# Altium schematic symbol library jlcpcb_2025_04_inductors_extended_0603.schlib: 1269 symbols (part 5 of 7) (continued)
## MLI1608F-1R0KT
designator L?  Inductance: 1uH
Inductor, 1uH, ±10%, 0.6Ω, 25mA, SMD 0603; Manufacturer: Meled; Manufacturer Part Number: MLI1608F-1R0KT; Self-Resonant Frequency: 75MHz; Q Factor: 35@10MHz; Package Size: 0603; JLCPCB Basic Part: No; JLCPCB Part Number: C2885856; Supplier 1: LCSC; Category: Inductors; Supplier Part Number 1: C2885856; Tolerance: ±10%; Rated Current: 25mA; DC Resistance: 0.6Ω; RoHS: Yes; ComponentLink1Description: Datasheet; ComponentLink1URL: https://wmsc.lcsc.com/wmsc/upload/file/pdf/v2/lcsc/2306021138_MetalLions-MLI1608F-1R0KT_C2885856.pdf; ComponentLink2Description: JLCPCB Part URL; ComponentLink2URL: https://jlcpcb.com/partdetail/C2885856; ComponentLink3Description: LCSC Part URL; ComponentLink3URL: https://lcsc.com/product-detail/Inductors-SMD_MetalLions-MetalLions-MLI1608F-1R0KT_C2885856.html
footprint IND-0603 (0603 (1608M) Inductor)
pins: 1, 2

## MLI1608F-1R2KT
designator L?  Inductance: 1.2uH
Inductor, 1.2uH, ±10%, 0.8Ω, 25mA, SMD 0603; Manufacturer: Meled; Manufacturer Part Number: MLI1608F-1R2KT; Self-Resonant Frequency: 65MHz; Q Factor: 35@10MHz; Package Size: 0603; JLCPCB Basic Part: No; JLCPCB Part Number: C2885857; Supplier 1: LCSC; Category: Inductors; Supplier Part Number 1: C2885857; Tolerance: ±10%; Rated Current: 25mA; DC Resistance: 0.8Ω; RoHS: Yes; ComponentLink1Description: Datasheet; ComponentLink1URL: https://wmsc.lcsc.com/wmsc/upload/file/pdf/v2/lcsc/2306021138_MetalLions-MLI1608F-1R2KT_C2885857.pdf; ComponentLink2Description: JLCPCB Part URL; ComponentLink2URL: https://jlcpcb.com/partdetail/C2885857; ComponentLink3Description: LCSC Part URL; ComponentLink3URL: https://lcsc.com/product-detail/Inductors-SMD_MetalLions-MetalLions-MLI1608F-1R2KT_C2885857.html
footprint IND-0603 (0603 (1608M) Inductor)
pins: 1, 2

## MLI1608F-1R8KT
designator L?  Inductance: 1.8uH
Inductor, 1.8uH, ±10%, 0.95Ω, 25mA, SMD 0603; Manufacturer: Meled; Manufacturer Part Number: MLI1608F-1R8KT; Self-Resonant Frequency: 55MHz; Q Factor: 35@10MHz; Package Size: 0603; JLCPCB Basic Part: No; JLCPCB Part Number: C2885859; Supplier 1: LCSC; Category: Inductors; Supplier Part Number 1: C2885859; Tolerance: ±10%; Rated Current: 25mA; DC Resistance: 0.95Ω; RoHS: Yes; ComponentLink1Description: Datasheet; ComponentLink1URL: https://wmsc.lcsc.com/wmsc/upload/file/pdf/v2/lcsc/2306021138_MetalLions-MLI1608F-1R8KT_C2885859.pdf; ComponentLink2Description: JLCPCB Part URL; ComponentLink2URL: https://jlcpcb.com/partdetail/C2885859; ComponentLink3Description: LCSC Part URL; ComponentLink3URL: https://lcsc.com/product-detail/Inductors-SMD_MetalLions-MetalLions-MLI1608F-1R8KT_C2885859.html
footprint IND-0603 (0603 (1608M) Inductor)
pins: 1, 2

## MLI1608F-6R8KT
designator L?  Inductance: 6.8uH
Inductor, 6.8uH, ±10%, 1.7Ω, 5mA, SMD 0603; Manufacturer: Meled; Manufacturer Part Number: MLI1608F-6R8KT; Self-Resonant Frequency: 20MHz; Q Factor: 35@4MHz; Package Size: 0603; JLCPCB Basic Part: No; JLCPCB Part Number: C2885866; Supplier 1: LCSC; Category: Inductors; Supplier Part Number 1: C2885866; Tolerance: ±10%; Rated Current: 5mA; DC Resistance: 1.7Ω; RoHS: Yes; ComponentLink1Description: Datasheet; ComponentLink1URL: https://wmsc.lcsc.com/wmsc/upload/file/pdf/v2/lcsc/2306021138_MetalLions-MLI1608F-6R8KT_C2885866.pdf; ComponentLink2Description: JLCPCB Part URL; ComponentLink2URL: https://jlcpcb.com/partdetail/C2885866; ComponentLink3Description: LCSC Part URL; ComponentLink3URL: https://lcsc.com/product-detail/Inductors-SMD_MetalLions-MetalLions-MLI1608F-6R8KT_C2885866.html
footprint IND-0603 (0603 (1608M) Inductor)
pins: 1, 2

## MLI1608F-100KT
designator L?  Inductance: 10uH
Inductor, 10uH, ±10%, 1.85Ω, 3mA, SMD 0603; Manufacturer: Meled; Manufacturer Part Number: MLI1608F-100KT; Self-Resonant Frequency: 17MHz; Q Factor: 30@2MHz; Package Size: 0603; JLCPCB Basic Part: No; JLCPCB Part Number: C2885868; Supplier 1: LCSC; Category: Inductors; Supplier Part Number 1: C2885868; Tolerance: ±10%; Rated Current: 3mA; DC Resistance: 1.85Ω; RoHS: Yes; ComponentLink1Description: Datasheet; ComponentLink1URL: https://wmsc.lcsc.com/wmsc/upload/file/pdf/v2/lcsc/2306021138_MetalLions-MLI1608F-100KT_C2885868.pdf; ComponentLink2Description: JLCPCB Part URL; ComponentLink2URL: https://jlcpcb.com/partdetail/C2885868; ComponentLink3Description: LCSC Part URL; ComponentLink3URL: https://lcsc.com/product-detail/Inductors-SMD_MetalLions-MetalLions-MLI1608F-100KT_C2885868.html
footprint IND-0603 (0603 (1608M) Inductor)
pins: 1, 2

## MLI1608F-150KT
designator L?  Inductance: 15uH
Inductor, 15uH, ±10%, 1.7Ω, 1mA, SMD 0603; Manufacturer: Meled; Manufacturer Part Number: MLI1608F-150KT; Self-Resonant Frequency: 14MHz; Q Factor: 20@1MHz; Package Size: 0603; JLCPCB Basic Part: No; JLCPCB Part Number: C2885870; Supplier 1: LCSC; Category: Inductors; Supplier Part Number 1: C2885870; Tolerance: ±10%; Rated Current: 1mA; DC Resistance: 1.7Ω; RoHS: Yes; ComponentLink1Description: Datasheet; ComponentLink1URL: https://wmsc.lcsc.com/wmsc/upload/file/pdf/v2/lcsc/2306021138_MetalLions-MLI1608F-150KT_C2885870.pdf; ComponentLink2Description: JLCPCB Part URL; ComponentLink2URL: https://jlcpcb.com/partdetail/C2885870; ComponentLink3Description: LCSC Part URL; ComponentLink3URL: https://lcsc.com/product-detail/Inductors-SMD_MetalLions-MetalLions-MLI1608F-150KT_C2885870.html
footprint IND-0603 (0603 (1608M) Inductor)
pins: 1, 2

## MLI1608F-270KT
designator L?  Inductance: 27uH
Inductor, 27uH, ±10%, 2.75Ω, 1mA, SMD 0603; Manufacturer: Meled; Manufacturer Part Number: MLI1608F-270KT; Self-Resonant Frequency: 10MHz; Q Factor: 20@1MHz; Package Size: 0603; JLCPCB Basic Part: No; JLCPCB Part Number: C2885873; Supplier 1: LCSC; Category: Inductors; Supplier Part Number 1: C2885873; Tolerance: ±10%; Rated Current: 1mA; DC Resistance: 2.75Ω; RoHS: Yes; ComponentLink1Description: Datasheet; ComponentLink1URL: https://wmsc.lcsc.com/wmsc/upload/file/pdf/v2/lcsc/2306021138_MetalLions-MLI1608F-270KT_C2885873.pdf; ComponentLink2Description: JLCPCB Part URL; ComponentLink2URL: https://jlcpcb.com/partdetail/C2885873; ComponentLink3Description: LCSC Part URL; ComponentLink3URL: https://lcsc.com/product-detail/Inductors-SMD_MetalLions-MetalLions-MLI1608F-270KT_C2885873.html
footprint IND-0603 (0603 (1608M) Inductor)
pins: 1, 2

## MLI1608F-R15KT
designator L?  Inductance: 0.15uH
Inductor, 0.15uH, ±10%, 0.6Ω, 50mA, SMD 0603; Manufacturer: Meled; Manufacturer Part Number: MLI1608F-R15KT; Self-Resonant Frequency: 180MHz; Q Factor: 15@25MHz; Package Size: 0603; JLCPCB Basic Part: No; JLCPCB Part Number: C2885846; Supplier 1: LCSC; Category: Inductors; Supplier Part Number 1: C2885846; Tolerance: ±10%; Rated Current: 50mA; DC Resistance: 0.6Ω; RoHS: Yes; ComponentLink1Description: Datasheet; ComponentLink1URL: https://wmsc.lcsc.com/wmsc/upload/file/pdf/v2/lcsc/2306021138_MetalLions-MLI1608F-R15KT_C2885846.pdf; ComponentLink2Description: JLCPCB Part URL; ComponentLink2URL: https://jlcpcb.com/partdetail/C2885846; ComponentLink3Description: LCSC Part URL; ComponentLink3URL: https://lcsc.com/product-detail/Inductors-SMD_MetalLions-MetalLions-MLI1608F-R15KT_C2885846.html
footprint IND-0603 (0603 (1608M) Inductor)
pins: 1, 2

## MLI1608F-R47KT
designator L?  Inductance: 470nH
Inductor, 470nH, ±10%, 1.35Ω, 35mA, SMD 0603; Manufacturer: Meled; Manufacturer Part Number: MLI1608F-R47KT; Self-Resonant Frequency: 105MHz; Q Factor: 15@25MHz; Package Size: 0603; JLCPCB Basic Part: No; JLCPCB Part Number: C2885852; Supplier 1: LCSC; Category: Inductors; Supplier Part Number 1: C2885852; Tolerance: ±10%; Rated Current: 35mA; DC Resistance: 1.35Ω; RoHS: Yes; ComponentLink1Description: Datasheet; ComponentLink1URL: https://wmsc.lcsc.com/wmsc/upload/file/pdf/v2/lcsc/2306021138_MetalLions-MLI1608F-R47KT_C2885852.pdf; ComponentLink2Description: JLCPCB Part URL; ComponentLink2URL: https://jlcpcb.com/partdetail/C2885852; ComponentLink3Description: LCSC Part URL; ComponentLink3URL: https://lcsc.com/product-detail/Inductors-SMD_MetalLions-MetalLions-MLI1608F-R47KT_C2885852.html
footprint IND-0603 (0603 (1608M) Inductor)
pins: 1, 2

## MLI1608F-R68KT
designator L?  Inductance: 0.68uH
Inductor, 0.68uH, ±10%, 1.7Ω, 35mA, SMD 0603; Manufacturer: Meled; Manufacturer Part Number: MLI1608F-R68KT; Self-Resonant Frequency: 90MHz; Q Factor: 15@25MHz; Package Size: 0603; JLCPCB Basic Part: No; JLCPCB Part Number: C2885854; Supplier 1: LCSC; Category: Inductors; Supplier Part Number 1: C2885854; Tolerance: ±10%; Rated Current: 35mA; DC Resistance: 1.7Ω; RoHS: Yes; ComponentLink1Description: Datasheet; ComponentLink1URL: https://wmsc.lcsc.com/wmsc/upload/file/pdf/v2/lcsc/2306021138_MetalLions-MLI1608F-R68KT_C2885854.pdf; ComponentLink2Description: JLCPCB Part URL; ComponentLink2URL: https://jlcpcb.com/partdetail/C2885854; ComponentLink3Description: LCSC Part URL; ComponentLink3URL: https://lcsc.com/product-detail/Inductors-SMD_MetalLions-MetalLions-MLI1608F-R68KT_C2885854.html
footprint IND-0603 (0603 (1608M) Inductor)
pins: 1, 2

## MLJ1608WR15JT000
designator L?  Inductance: 150nH
Inductor, 150nH, ±5%, 160mΩ, SMD 0603; Manufacturer: TDK; Manufacturer Part Number: MLJ1608WR15JT000; Saturation Current: 600mA; Self-Resonant Frequency: 350MHz; Q Factor: 15@25MHz; Package Size: 0603; JLCPCB Basic Part: No; JLCPCB Part Number: C3910555; Supplier 1: LCSC; Category: Inductors; Supplier Part Number 1: C3910555; Tolerance: ±5%; DC Resistance: 160mΩ; RoHS: Yes; ComponentLink1Description: Datasheet; ComponentLink1URL: https://wmsc.lcsc.com/wmsc/upload/file/pdf/v2/lcsc/2401221719_TDK-MLJ1608WR15JT000_C3910555.pdf; ComponentLink2Description: JLCPCB Part URL; ComponentLink2URL: https://jlcpcb.com/partdetail/C3910555; ComponentLink3Description: LCSC Part URL; ComponentLink3URL: https://lcsc.com/product-detail/Inductors-SMD_TDK-TDK-MLJ1608WR15JT000_C3910555.html
footprint IND-0603 (0603 (1608M) Inductor)
pins: 1, 2

## MLJ1608WR16JT000
designator L?  Inductance: 160nH
Inductor, 160nH, ±5%, 160mΩ, 700mA, SMD 0603; Manufacturer: TDK; Manufacturer Part Number: MLJ1608WR16JT000; Saturation Current: 750mA; Self-Resonant Frequency: 450MHz; Q Factor: 15@25MHz; Package Size: 0603; JLCPCB Basic Part: No; JLCPCB Part Number: C434822; Supplier 1: LCSC; Category: Inductors; Supplier Part Number 1: C434822; Tolerance: ±5%; Rated Current: 700mA; DC Resistance: 160mΩ; RoHS: Yes; ComponentLink1Description: Datasheet; ComponentLink1URL: https://wmsc.lcsc.com/wmsc/upload/file/pdf/v2/lcsc/2304140030_TDK-MLJ1608WR16JT000_C434822.pdf; ComponentLink2Description: JLCPCB Part URL; ComponentLink2URL: https://jlcpcb.com/partdetail/C434822; ComponentLink3Description: LCSC Part URL; ComponentLink3URL: https://lcsc.com/product-detail/Inductors-SMD_TDK-TDK-MLJ1608WR16JT000_C434822.html
footprint IND-0603 (0603 (1608M) Inductor)
pins: 1, 2

## MLJ1608WR18JT000
designator L?  Inductance: 180nH
Inductor, 180nH, ±5%, 200mΩ, 650mA, SMD 0603; Manufacturer: TDK; Manufacturer Part Number: MLJ1608WR18JT000; Saturation Current: 700mA; Self-Resonant Frequency: 440MHz; Q Factor: 15@25MHz; Package Size: 0603; JLCPCB Basic Part: No; JLCPCB Part Number: C502011; Supplier 1: LCSC; Category: Inductors; Supplier Part Number 1: C502011; Tolerance: ±5%; Rated Current: 650mA; DC Resistance: 200mΩ; RoHS: Yes; ComponentLink1Description: Datasheet; ComponentLink1URL: https://wmsc.lcsc.com/wmsc/upload/file/pdf/v2/lcsc/2003301511_TDK-MLJ1608WR18JT000_C502011.pdf; ComponentLink2Description: JLCPCB Part URL; ComponentLink2URL: https://jlcpcb.com/partdetail/C502011; ComponentLink3Description: LCSC Part URL; ComponentLink3URL: https://lcsc.com/product-detail/Inductors-SMD_TDK-TDK-MLJ1608WR18JT000_C502011.html
footprint IND-0603 (0603 (1608M) Inductor)
pins: 1, 2

## MLJ1608WR27JT000
designator L?  Inductance: 270nH
Inductor, 270nH, ±5%, 290mΩ, 550mA, SMD 0603; Manufacturer: TDK; Manufacturer Part Number: MLJ1608WR27JT000; Saturation Current: 650mA; Self-Resonant Frequency: 350MHz; Q Factor: 15@25MHz; Package Size: 0603; JLCPCB Basic Part: No; JLCPCB Part Number: C2041707; Supplier 1: LCSC; Category: Inductors; Supplier Part Number 1: C2041707; Tolerance: ±5%; Rated Current: 550mA; DC Resistance: 290mΩ; RoHS: Yes; ComponentLink1Description: Datasheet; ComponentLink1URL: https://wmsc.lcsc.com/wmsc/upload/file/pdf/v2/lcsc/2304140030_TDK-MLJ1608WR27JT000_C2041707.pdf; ComponentLink2Description: JLCPCB Part URL; ComponentLink2URL: https://jlcpcb.com/partdetail/C2041707; ComponentLink3Description: LCSC Part URL; ComponentLink3URL: https://lcsc.com/product-detail/Inductors-SMD_TDK-TDK-MLJ1608WR27JT000_C2041707.html
footprint IND-0603 (0603 (1608M) Inductor)
pins: 1, 2

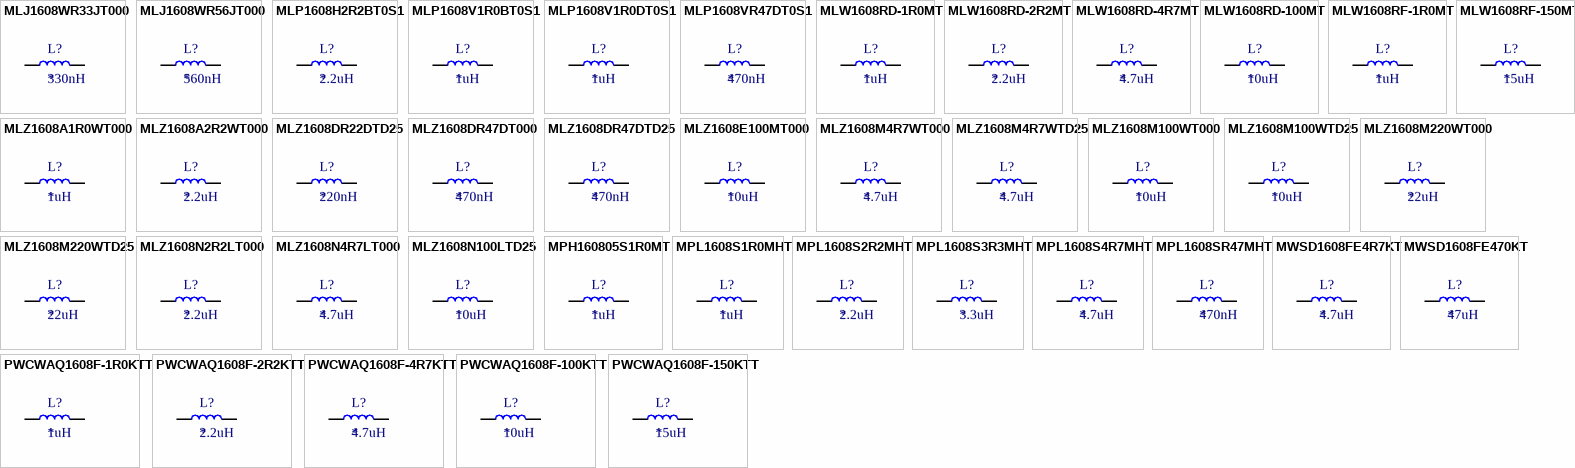
[diagram p22: symbols MLJ1608WR33JT000 to PWCWAQ1608F-150KTT]

## MLJ1608WR33JT000
designator L?  Inductance: 330nH
Inductor, 330nH, ±5%, 320mΩ, 500mA, SMD 0603; Manufacturer: TDK; Manufacturer Part Number: MLJ1608WR33JT000; Saturation Current: 650mA; Self-Resonant Frequency: 320MHz; Q Factor: 15@25MHz; Package Size: 0603; JLCPCB Basic Part: No; JLCPCB Part Number: C502010; Supplier 1: LCSC; Category: Inductors; Supplier Part Number 1: C502010; Tolerance: ±5%; Rated Current: 500mA; DC Resistance: 320mΩ; RoHS: Yes; ComponentLink1Description: Datasheet; ComponentLink1URL: https://wmsc.lcsc.com/wmsc/upload/file/pdf/v2/lcsc/2304140030_TDK-MLJ1608WR33JT000_C502010.pdf; ComponentLink2Description: JLCPCB Part URL; ComponentLink2URL: https://jlcpcb.com/partdetail/C502010; ComponentLink3Description: LCSC Part URL; ComponentLink3URL: https://lcsc.com/product-detail/Inductors-SMD_TDK-TDK-MLJ1608WR33JT000_C502010.html
footprint IND-0603 (0603 (1608M) Inductor)
pins: 1, 2

## MLJ1608WR56JT000
designator L?  Inductance: 560nH
Inductor, 560nH, ±5%, 520mΩ, 400mA, SMD 0603; Manufacturer: TDK; Manufacturer Part Number: MLJ1608WR56JT000; Saturation Current: 600mA; Self-Resonant Frequency: 230MHz; Q Factor: 15@25MHz; Package Size: 0603; JLCPCB Basic Part: No; JLCPCB Part Number: C502009; Supplier 1: LCSC; Category: Inductors; Supplier Part Number 1: C502009; Tolerance: ±5%; Rated Current: 400mA; DC Resistance: 520mΩ; RoHS: Yes; ComponentLink1Description: Datasheet; ComponentLink1URL: https://wmsc.lcsc.com/wmsc/upload/file/pdf/v2/lcsc/2304140030_TDK-MLJ1608WR56JT000_C502009.pdf; ComponentLink2Description: JLCPCB Part URL; ComponentLink2URL: https://jlcpcb.com/partdetail/C502009; ComponentLink3Description: LCSC Part URL; ComponentLink3URL: https://lcsc.com/product-detail/Inductors-SMD_TDK-TDK-MLJ1608WR56JT000_C502009.html
footprint IND-0603 (0603 (1608M) Inductor)
pins: 1, 2

## MLP1608H2R2BT0S1
designator L?  Inductance: 2.2uH
Inductor, 2.2uH, ±20%, 390mΩ, 750mA, SMD 0603; Manufacturer: TDK; Manufacturer Part Number: MLP1608H2R2BT0S1; Package Size: 0603; JLCPCB Basic Part: No; JLCPCB Part Number: C129931; Supplier 1: LCSC; Category: Inductors; Supplier Part Number 1: C129931; Tolerance: ±20%; Rated Current: 750mA; DC Resistance: 390mΩ; RoHS: Yes; ComponentLink1Description: Datasheet; ComponentLink1URL: https://wmsc.lcsc.com/wmsc/upload/file/pdf/v2/lcsc/1811131642_TDK-MLP1608H2R2BT0S1_C129931.pdf; ComponentLink2Description: JLCPCB Part URL; ComponentLink2URL: https://jlcpcb.com/partdetail/C129931; ComponentLink3Description: LCSC Part URL; ComponentLink3URL: https://lcsc.com/product-detail/Inductors-SMD_TDK-TDK-MLP1608H2R2BT0S1_C129931.html
footprint IND-0603 (0603 (1608M) Inductor)
pins: 1, 2

## MLP1608V1R0BT0S1
designator L?  Inductance: 1uH
Inductor, 1uH, ±20%, 300mΩ, 700mA, SMD 0603; Manufacturer: TDK; Manufacturer Part Number: MLP1608V1R0BT0S1; Package Size: 0603; JLCPCB Basic Part: No; JLCPCB Part Number: C383366; Supplier 1: LCSC; Category: Inductors; Supplier Part Number 1: C383366; Tolerance: ±20%; Rated Current: 700mA; DC Resistance: 300mΩ; RoHS: Yes; ComponentLink1Description: Datasheet; ComponentLink1URL: https://wmsc.lcsc.com/wmsc/upload/file/pdf/v2/lcsc/1912111437_TDK-MLP1608V1R0BT0S1_C383366.pdf; ComponentLink2Description: JLCPCB Part URL; ComponentLink2URL: https://jlcpcb.com/partdetail/C383366; ComponentLink3Description: LCSC Part URL; ComponentLink3URL: https://lcsc.com/product-detail/Inductors-SMD_TDK-TDK-MLP1608V1R0BT0S1_C383366.html
footprint IND-0603 (0603 (1608M) Inductor)
pins: 1, 2

## MLP1608V1R0DT0S1
designator L?  Inductance: 1uH
Inductor, 1uH, ±20%, 300mΩ, 700mA, SMD 0603; Manufacturer: TDK; Manufacturer Part Number: MLP1608V1R0DT0S1; Package Size: 0603; JLCPCB Basic Part: No; JLCPCB Part Number: C307741; Supplier 1: LCSC; Category: Inductors; Supplier Part Number 1: C307741; Tolerance: ±20%; Rated Current: 700mA; DC Resistance: 300mΩ; RoHS: Yes; ComponentLink1Description: Datasheet; ComponentLink1URL: https://wmsc.lcsc.com/wmsc/upload/file/pdf/v2/lcsc/2304140030_TDK-MLP1608V1R0DT0S1_C307741.pdf; ComponentLink2Description: JLCPCB Part URL; ComponentLink2URL: https://jlcpcb.com/partdetail/C307741; ComponentLink3Description: LCSC Part URL; ComponentLink3URL: https://lcsc.com/product-detail/Inductors-SMD_TDK-TDK-MLP1608V1R0DT0S1_C307741.html
footprint IND-0603 (0603 (1608M) Inductor)
pins: 1, 2

## MLP1608VR47DT0S1
designator L?  Inductance: 470nH
Inductor, 470nH, ±20%, 260mΩ, 800mA, SMD 0603; Manufacturer: TDK; Manufacturer Part Number: MLP1608VR47DT0S1; Package Size: 0603; JLCPCB Basic Part: No; JLCPCB Part Number: C105533; Supplier 1: LCSC; Category: Inductors; Supplier Part Number 1: C105533; Tolerance: ±20%; Rated Current: 800mA; DC Resistance: 260mΩ; RoHS: Yes; ComponentLink1Description: Datasheet; ComponentLink1URL: https://wmsc.lcsc.com/wmsc/upload/file/pdf/v2/lcsc/1811131643_TDK-MLP1608VR47DT0S1_C105533.pdf; ComponentLink2Description: JLCPCB Part URL; ComponentLink2URL: https://jlcpcb.com/partdetail/C105533; ComponentLink3Description: LCSC Part URL; ComponentLink3URL: https://lcsc.com/product-detail/Inductors-SMD_TDK-TDK-MLP1608VR47DT0S1_C105533.html
footprint IND-0603 (0603 (1608M) Inductor)
pins: 1, 2

## MLW1608RD-1R0MT
designator L?  Inductance: 1uH
Inductor, 1uH, ±20%, SMD 0603; Manufacturer: Meled; Manufacturer Part Number: MLW1608RD-1R0MT; Package Size: 0603; JLCPCB Basic Part: No; JLCPCB Part Number: C2885957; Supplier 1: LCSC; Category: Inductors; Supplier Part Number 1: C2885957; Tolerance: ±20%; RoHS: Yes; ComponentLink1Description: Datasheet; ComponentLink1URL: https://wmsc.lcsc.com/wmsc/upload/file/pdf/v2/lcsc/2306021139_MetalLions-MLW1608RD-1R0MT_C2885957.pdf; ComponentLink2Description: JLCPCB Part URL; ComponentLink2URL: https://jlcpcb.com/partdetail/C2885957; ComponentLink3Description: LCSC Part URL; ComponentLink3URL: https://lcsc.com/product-detail/Inductors-SMD_MetalLions-MetalLions-MLW1608RD-1R0MT_C2885957.html
footprint IND-0603 (0603 (1608M) Inductor)
pins: 1, 2

## MLW1608RD-2R2MT
designator L?  Inductance: 2.2uH
Inductor, 2.2uH, ±20%, SMD 0603; Manufacturer: Meled; Manufacturer Part Number: MLW1608RD-2R2MT; Package Size: 0603; JLCPCB Basic Part: No; JLCPCB Part Number: C2885958; Supplier 1: LCSC; Category: Inductors; Supplier Part Number 1: C2885958; Tolerance: ±20%; RoHS: Yes; ComponentLink1Description: Datasheet; ComponentLink1URL: https://wmsc.lcsc.com/wmsc/upload/file/pdf/v2/lcsc/2306021139_MetalLions-MLW1608RD-2R2MT_C2885958.pdf; ComponentLink2Description: JLCPCB Part URL; ComponentLink2URL: https://jlcpcb.com/partdetail/C2885958; ComponentLink3Description: LCSC Part URL; ComponentLink3URL: https://lcsc.com/product-detail/Inductors-SMD_Meled-Meled-MLW1608RD-2R2MT_C2885958.html
footprint IND-0603 (0603 (1608M) Inductor)
pins: 1, 2

## MLW1608RD-4R7MT
designator L?  Inductance: 4.7uH
Inductor, 4.7uH, ±20%, SMD 0603; Manufacturer: Meled; Manufacturer Part Number: MLW1608RD-4R7MT; Package Size: 0603; JLCPCB Basic Part: No; JLCPCB Part Number: C2885959; Supplier 1: LCSC; Category: Inductors; Supplier Part Number 1: C2885959; Tolerance: ±20%; RoHS: Yes; ComponentLink1Description: Datasheet; ComponentLink1URL: https://wmsc.lcsc.com/wmsc/upload/file/pdf/v2/lcsc/2306021139_MetalLions-MLW1608RD-4R7MT_C2885959.pdf; ComponentLink2Description: JLCPCB Part URL; ComponentLink2URL: https://jlcpcb.com/partdetail/C2885959; ComponentLink3Description: LCSC Part URL; ComponentLink3URL: https://lcsc.com/product-detail/Inductors-SMD_MetalLions-MetalLions-MLW1608RD-4R7MT_C2885959.html
footprint IND-0603 (0603 (1608M) Inductor)
pins: 1, 2

## MLW1608RD-100MT
designator L?  Inductance: 10uH
Inductor, 10uH, ±20%, SMD 0603; Manufacturer: Meled; Manufacturer Part Number: MLW1608RD-100MT; Package Size: 0603; JLCPCB Basic Part: No; JLCPCB Part Number: C2885960; Supplier 1: LCSC; Category: Inductors; Supplier Part Number 1: C2885960; Tolerance: ±20%; RoHS: Yes; ComponentLink1Description: Datasheet; ComponentLink1URL: https://wmsc.lcsc.com/wmsc/upload/file/pdf/v2/lcsc/2306021139_MetalLions-MLW1608RD-100MT_C2885960.pdf; ComponentLink2Description: JLCPCB Part URL; ComponentLink2URL: https://jlcpcb.com/partdetail/C2885960; ComponentLink3Description: LCSC Part URL; ComponentLink3URL: https://lcsc.com/product-detail/Inductors-SMD_MetalLions-MetalLions-MLW1608RD-100MT_C2885960.html
footprint IND-0603 (0603 (1608M) Inductor)
pins: 1, 2

## MLW1608RF-1R0MT
designator L?  Inductance: 1uH
Inductor, 1uH, ±20%, 320mΩ, 860mA, SMD 0603; Manufacturer: Meled; Manufacturer Part Number: MLW1608RF-1R0MT; Self-Resonant Frequency: 390MHz; Package Size: 0603; JLCPCB Basic Part: No; JLCPCB Part Number: C2844624; Supplier 1: LCSC; Category: Inductors; Supplier Part Number 1: C2844624; Tolerance: ±20%; Rated Current: 860mA; DC Resistance: 320mΩ; RoHS: Yes; ComponentLink1Description: Datasheet; ComponentLink1URL: https://wmsc.lcsc.com/wmsc/upload/file/pdf/v2/lcsc/2306021145_MetalLions-MLW1608RF-1R0MT_C2844624.pdf; ComponentLink2Description: JLCPCB Part URL; ComponentLink2URL: https://jlcpcb.com/partdetail/C2844624; ComponentLink3Description: LCSC Part URL; ComponentLink3URL: https://lcsc.com/product-detail/Inductors-SMD_MetalLions-MetalLions-MLW1608RF-1R0MT_C2844624.html
footprint IND-0603 (0603 (1608M) Inductor)
pins: 1, 2

## MLW1608RF-150MT
designator L?  Inductance: 15uH
Inductor, 15uH, ±20%, 2.6Ω, 240mA, SMD 0603; Manufacturer: Meled; Manufacturer Part Number: MLW1608RF-150MT; Self-Resonant Frequency: 29MHz; Package Size: 0603; JLCPCB Basic Part: No; JLCPCB Part Number: C2844628; Supplier 1: LCSC; Category: Inductors; Supplier Part Number 1: C2844628; Tolerance: ±20%; Rated Current: 240mA; DC Resistance: 2.6Ω; RoHS: Yes; ComponentLink1Description: Datasheet; ComponentLink1URL: https://wmsc.lcsc.com/wmsc/upload/file/pdf/v2/lcsc/2306021145_MetalLions-MLW1608RF-150MT_C2844628.pdf; ComponentLink2Description: JLCPCB Part URL; ComponentLink2URL: https://jlcpcb.com/partdetail/C2844628; ComponentLink3Description: LCSC Part URL; ComponentLink3URL: https://lcsc.com/product-detail/Inductors-SMD_MetalLions-MetalLions-MLW1608RF-150MT_C2844628.html
footprint IND-0603 (0603 (1608M) Inductor)
pins: 1, 2

## MLZ1608A1R0WT000
designator L?  Inductance: 1uH
Inductor, 1uH, ±20%, 150mΩ, 600mA, SMD 0603; Manufacturer: TDK; Manufacturer Part Number: MLZ1608A1R0WT000; Saturation Current: 190mA; Package Size: 0603; JLCPCB Basic Part: No; JLCPCB Part Number: C307748; Supplier 1: LCSC; Category: Inductors; Supplier Part Number 1: C307748; Tolerance: ±20%; Rated Current: 600mA; DC Resistance: 150mΩ; RoHS: Yes; ComponentLink1Description: Datasheet; ComponentLink1URL: https://wmsc.lcsc.com/wmsc/upload/file/pdf/v2/lcsc/1811131655_TDK-MLZ1608A1R0WT000_C307748.pdf; ComponentLink2Description: JLCPCB Part URL; ComponentLink2URL: https://jlcpcb.com/partdetail/C307748; ComponentLink3Description: LCSC Part URL; ComponentLink3URL: https://lcsc.com/product-detail/Inductors-SMD_TDK-TDK-MLZ1608A1R0WT000_C307748.html
footprint IND-0603 (0603 (1608M) Inductor)
pins: 1, 2

## MLZ1608A2R2WT000
designator L?  Inductance: 2.2uH
Inductor, 2.2uH, ±20%, 250mΩ, 500mA, SMD 0603; Manufacturer: TDK; Manufacturer Part Number: MLZ1608A2R2WT000; Saturation Current: 130mA; Package Size: 0603; JLCPCB Basic Part: No; JLCPCB Part Number: C76797; Supplier 1: LCSC; Category: Inductors; Supplier Part Number 1: C76797; Tolerance: ±20%; Rated Current: 500mA; DC Resistance: 250mΩ; RoHS: Yes; ComponentLink1Description: Datasheet; ComponentLink1URL: https://wmsc.lcsc.com/wmsc/upload/file/pdf/v2/lcsc/1811131630_TDK-MLZ1608A2R2WT000_C76797.pdf; ComponentLink2Description: JLCPCB Part URL; ComponentLink2URL: https://jlcpcb.com/partdetail/C76797; ComponentLink3Description: LCSC Part URL; ComponentLink3URL: https://lcsc.com/product-detail/Inductors-SMD_TDK-TDK-MLZ1608A2R2WT000_C76797.html
footprint IND-0603 (0603 (1608M) Inductor)
pins: 1, 2

## MLZ1608DR22DTD25
designator L?  Inductance: 220nH
Inductor, 220nH, ±20%, 270mΩ, 600mA, SMD 0603; Manufacturer: TDK; Manufacturer Part Number: MLZ1608DR22DTD25; Saturation Current: 550mA; Package Size: 0603; JLCPCB Basic Part: No; JLCPCB Part Number: C404773; Supplier 1: LCSC; Category: Inductors; Supplier Part Number 1: C404773; Tolerance: ±20%; Rated Current: 600mA; DC Resistance: 270mΩ; RoHS: Yes; ComponentLink1Description: Datasheet; ComponentLink1URL: https://wmsc.lcsc.com/wmsc/upload/file/pdf/v2/lcsc/2304140030_TDK-MLZ1608DR22DTD25_C404773.pdf; ComponentLink2Description: JLCPCB Part URL; ComponentLink2URL: https://jlcpcb.com/partdetail/C404773; ComponentLink3Description: LCSC Part URL; ComponentLink3URL: https://lcsc.com/product-detail/Inductors-SMD_TDK-TDK-MLZ1608DR22DTD25_C404773.html
footprint IND-0603 (0603 (1608M) Inductor)
pins: 1, 2

## MLZ1608DR47DT000
designator L?  Inductance: 470nH
Inductor, 470nH, ±20%, 420mΩ, 500mA, SMD 0603; Manufacturer: TDK; Manufacturer Part Number: MLZ1608DR47DT000; Saturation Current: 400mA; Self-Resonant Frequency: 25MHz; Package Size: 0603; JLCPCB Basic Part: No; JLCPCB Part Number: C383392; Supplier 1: LCSC; Category: Inductors; Supplier Part Number 1: C383392; Tolerance: ±20%; Rated Current: 500mA; DC Resistance: 420mΩ; RoHS: Yes; ComponentLink1Description: Datasheet; ComponentLink1URL: https://wmsc.lcsc.com/wmsc/upload/file/pdf/v2/lcsc/2304140030_TDK-MLZ1608DR47DT000_C383392.pdf; ComponentLink2Description: JLCPCB Part URL; ComponentLink2URL: https://jlcpcb.com/partdetail/C383392; ComponentLink3Description: LCSC Part URL; ComponentLink3URL: https://lcsc.com/product-detail/Inductors-SMD_TDK-TDK-MLZ1608DR47DT000_C383392.html
footprint IND-0603 (0603 (1608M) Inductor)
pins: 1, 2

## MLZ1608DR47DTD25
designator L?  Inductance: 470nH
Inductor, 470nH, ±20%, 420mΩ, 500mA, SMD 0603; Manufacturer: TDK; Manufacturer Part Number: MLZ1608DR47DTD25; Saturation Current: 400mA; Package Size: 0603; JLCPCB Basic Part: No; JLCPCB Part Number: C404774; Supplier 1: LCSC; Category: Inductors; Supplier Part Number 1: C404774; Tolerance: ±20%; Rated Current: 500mA; DC Resistance: 420mΩ; RoHS: Yes; ComponentLink1Description: Datasheet; ComponentLink1URL: https://wmsc.lcsc.com/wmsc/upload/file/pdf/v2/lcsc/2304140030_TDK-MLZ1608DR47DTD25_C404774.pdf; ComponentLink2Description: JLCPCB Part URL; ComponentLink2URL: https://jlcpcb.com/partdetail/C404774; ComponentLink3Description: LCSC Part URL; ComponentLink3URL: https://lcsc.com/product-detail/Inductors-SMD_TDK-TDK-MLZ1608DR47DTD25_C404774.html
footprint IND-0603 (0603 (1608M) Inductor)
pins: 1, 2

## MLZ1608E100MT000
designator L?  Inductance: 10uH
Inductor, 10uH, ±20%, 900mΩ, 40mA, SMD 0603; Manufacturer: TDK; Manufacturer Part Number: MLZ1608E100MT000; Self-Resonant Frequency: 2MHz; Package Size: 0603; JLCPCB Basic Part: No; JLCPCB Part Number: C340673; Supplier 1: LCSC; Category: Inductors; Supplier Part Number 1: C340673; Tolerance: ±20%; Rated Current: 40mA; DC Resistance: 900mΩ; RoHS: Yes; ComponentLink1Description: Datasheet; ComponentLink2Description: JLCPCB Part URL; ComponentLink2URL: https://jlcpcb.com/partdetail/C340673; ComponentLink3Description: LCSC Part URL; ComponentLink3URL: https://lcsc.com/product-detail/Inductors-SMD_TDK-TDK-MLZ1608E100MT000_C340673.html
footprint IND-0603 (0603 (1608M) Inductor)
pins: 1, 2

## MLZ1608M4R7WT000
designator L?  Inductance: 4.7uH
Inductor, 4.7uH, ±20%, 500mΩ, 350mA, SMD 0603; Manufacturer: TDK; Manufacturer Part Number: MLZ1608M4R7WT000; Saturation Current: 120mA; Package Size: 0603; JLCPCB Basic Part: No; JLCPCB Part Number: C76799; Supplier 1: LCSC; Category: Inductors; Supplier Part Number 1: C76799; Tolerance: ±20%; Rated Current: 350mA; DC Resistance: 500mΩ; RoHS: Yes; ComponentLink1Description: Datasheet; ComponentLink1URL: https://wmsc.lcsc.com/wmsc/upload/file/pdf/v2/lcsc/2304140030_TDK-MLZ1608M4R7WT000_C76799.pdf; ComponentLink2Description: JLCPCB Part URL; ComponentLink2URL: https://jlcpcb.com/partdetail/C76799; ComponentLink3Description: LCSC Part URL; ComponentLink3URL: https://lcsc.com/product-detail/Inductors-SMD_TDK-TDK-MLZ1608M4R7WT000_C76799.html
footprint IND-0603 (0603 (1608M) Inductor)
pins: 1, 2

## MLZ1608M4R7WTD25
designator L?  Inductance: 4.7uH
Inductor, 4.7uH, ±20%, 500mΩ, SMD 0603; Manufacturer: TDK; Manufacturer Part Number: MLZ1608M4R7WTD25; Saturation Current: 120mA; Package Size: 0603; JLCPCB Basic Part: No; JLCPCB Part Number: C2043901; Supplier 1: LCSC; Category: Inductors; Supplier Part Number 1: C2043901; Tolerance: ±20%; DC Resistance: 500mΩ; RoHS: Yes; ComponentLink1Description: Datasheet; ComponentLink1URL: https://wmsc.lcsc.com/wmsc/upload/file/pdf/v2/lcsc/2304140030_TDK-MLZ1608M4R7WTD25_C2043901.pdf; ComponentLink2Description: JLCPCB Part URL; ComponentLink2URL: https://jlcpcb.com/partdetail/C2043901; ComponentLink3Description: LCSC Part URL; ComponentLink3URL: https://lcsc.com/product-detail/Inductors-SMD_TDK-TDK-MLZ1608M4R7WTD25_C2043901.html
footprint IND-0603 (0603 (1608M) Inductor)
pins: 1, 2

## MLZ1608M100WT000
designator L?  Inductance: 10uH
Inductor, 10uH, ±20%, 1.05Ω, 250mA, SMD 0603; Manufacturer: TDK; Manufacturer Part Number: MLZ1608M100WT000; Saturation Current: 90mA; Self-Resonant Frequency: 2MHz; Package Size: 0603; JLCPCB Basic Part: No; JLCPCB Part Number: C76798; Supplier 1: LCSC; Category: Inductors; Supplier Part Number 1: C76798; Tolerance: ±20%; Rated Current: 250mA; DC Resistance: 1.05Ω; RoHS: Yes; ComponentLink1Description: Datasheet; ComponentLink1URL: https://wmsc.lcsc.com/wmsc/upload/file/pdf/v2/lcsc/2304140030_TDK-MLZ1608M100WT000_C76798.pdf; ComponentLink2Description: JLCPCB Part URL; ComponentLink2URL: https://jlcpcb.com/partdetail/C76798; ComponentLink3Description: LCSC Part URL; ComponentLink3URL: https://lcsc.com/product-detail/Inductors-SMD_TDK-TDK-MLZ1608M100WT000_C76798.html
footprint IND-0603 (0603 (1608M) Inductor)
pins: 1, 2

## MLZ1608M100WTD25
designator L?  Inductance: 10uH
Inductor, 10uH, ±20%, 1.05Ω, 250mA, SMD 0603; Manufacturer: TDK; Manufacturer Part Number: MLZ1608M100WTD25; Saturation Current: 90mA; Package Size: 0603; JLCPCB Basic Part: No; JLCPCB Part Number: C2047264; Supplier 1: LCSC; Category: Inductors; Supplier Part Number 1: C2047264; Tolerance: ±20%; Rated Current: 250mA; DC Resistance: 1.05Ω; RoHS: Yes; ComponentLink1Description: Datasheet; ComponentLink1URL: https://wmsc.lcsc.com/wmsc/upload/file/pdf/v2/lcsc/2202010330_TDK-MLZ1608M100WTD25_C2047264.pdf; ComponentLink2Description: JLCPCB Part URL; ComponentLink2URL: https://jlcpcb.com/partdetail/C2047264; ComponentLink3Description: LCSC Part URL; ComponentLink3URL: https://lcsc.com/product-detail/Inductors-SMD_TDK-TDK-MLZ1608M100WTD25_C2047264.html
footprint IND-0603 (0603 (1608M) Inductor)
pins: 1, 2

## MLZ1608M220WT000
designator L?  Inductance: 22uH
Inductor, 22uH, ±20%, 2.4Ω, 150mA, SMD 0603; Manufacturer: TDK; Manufacturer Part Number: MLZ1608M220WT000; Saturation Current: 55mA; Package Size: 0603; JLCPCB Basic Part: No; JLCPCB Part Number: C383393; Supplier 1: LCSC; Category: Inductors; Supplier Part Number 1: C383393; Tolerance: ±20%; Rated Current: 150mA; DC Resistance: 2.4Ω; RoHS: Yes; ComponentLink1Description: Datasheet; ComponentLink1URL: https://wmsc.lcsc.com/wmsc/upload/file/pdf/v2/lcsc/2004022002_TDK-MLZ1608M220WT000_C383393.pdf; ComponentLink2Description: JLCPCB Part URL; ComponentLink2URL: https://jlcpcb.com/partdetail/C383393; ComponentLink3Description: LCSC Part URL; ComponentLink3URL: https://lcsc.com/product-detail/Inductors-SMD_TDK-TDK-MLZ1608M220WT000_C383393.html
footprint IND-0603 (0603 (1608M) Inductor)
pins: 1, 2

## MLZ1608M220WTD25
designator L?  Inductance: 22uH
Inductor, 22uH, ±20%, 2.4Ω, 150mA, SMD 0603; Manufacturer: TDK; Manufacturer Part Number: MLZ1608M220WTD25; Saturation Current: 55mA; Package Size: 0603; JLCPCB Basic Part: No; JLCPCB Part Number: C307749; Supplier 1: LCSC; Category: Inductors; Supplier Part Number 1: C307749; Tolerance: ±20%; Rated Current: 150mA; DC Resistance: 2.4Ω; RoHS: Yes; ComponentLink1Description: Datasheet; ComponentLink1URL: https://wmsc.lcsc.com/wmsc/upload/file/pdf/v2/lcsc/1811131650_TDK-MLZ1608M220WTD25_C307749.pdf; ComponentLink2Description: JLCPCB Part URL; ComponentLink2URL: https://jlcpcb.com/partdetail/C307749; ComponentLink3Description: LCSC Part URL; ComponentLink3URL: https://lcsc.com/product-detail/Inductors-SMD_TDK-TDK-MLZ1608M220WTD25_C307749.html
footprint IND-0603 (0603 (1608M) Inductor)
pins: 1, 2

## MLZ1608N2R2LT000
designator L?  Inductance: 2.2uH
Inductor, 2.2uH, ±20%, 180mΩ, 500mA, SMD 0603; Manufacturer: TDK; Manufacturer Part Number: MLZ1608N2R2LT000; Saturation Current: 110mA; Self-Resonant Frequency: 2MHz; Package Size: 0603; JLCPCB Basic Part: No; JLCPCB Part Number: C531282; Supplier 1: LCSC; Category: Inductors; Supplier Part Number 1: C531282; Tolerance: ±20%; Rated Current: 500mA; DC Resistance: 180mΩ; RoHS: Yes; ComponentLink1Description: Datasheet; ComponentLink1URL: https://wmsc.lcsc.com/wmsc/upload/file/pdf/v2/lcsc/2304140030_TDK-MLZ1608N2R2LT000_C531282.pdf; ComponentLink2Description: JLCPCB Part URL; ComponentLink2URL: https://jlcpcb.com/partdetail/C531282; ComponentLink3Description: LCSC Part URL; ComponentLink3URL: https://lcsc.com/product-detail/Inductors-SMD_TDK-TDK-MLZ1608N2R2LT000_C531282.html
footprint IND-0603 (0603 (1608M) Inductor)
pins: 1, 2

## MLZ1608N4R7LT000
designator L?  Inductance: 4.7uH
Inductor, 4.7uH, ±20%, 320mΩ, 400mA, SMD 0603; Manufacturer: TDK; Manufacturer Part Number: MLZ1608N4R7LT000; Saturation Current: 80mA; Package Size: 0603; JLCPCB Basic Part: No; JLCPCB Part Number: C383396; Supplier 1: LCSC; Category: Inductors; Supplier Part Number 1: C383396; Tolerance: ±20%; Rated Current: 400mA; DC Resistance: 320mΩ; RoHS: Yes; ComponentLink1Description: Datasheet; ComponentLink1URL: https://wmsc.lcsc.com/wmsc/upload/file/pdf/v2/lcsc/2304140030_TDK-MLZ1608N4R7LT000_C383396.pdf; ComponentLink2Description: JLCPCB Part URL; ComponentLink2URL: https://jlcpcb.com/partdetail/C383396; ComponentLink3Description: LCSC Part URL; ComponentLink3URL: https://lcsc.com/product-detail/Inductors-SMD_TDK-TDK-MLZ1608N4R7LT000_C383396.html
footprint IND-0603 (0603 (1608M) Inductor)
pins: 1, 2

## MLZ1608N100LTD25
designator L?  Inductance: 10uH
Inductor, 10uH, ±20%, 600mΩ, 300mA, SMD 0603; Manufacturer: TDK; Manufacturer Part Number: MLZ1608N100LTD25; Saturation Current: 60mA; Package Size: 0603; JLCPCB Basic Part: No; JLCPCB Part Number: C307750; Supplier 1: LCSC; Category: Inductors; Supplier Part Number 1: C307750; Tolerance: ±20%; Rated Current: 300mA; DC Resistance: 600mΩ; RoHS: Yes; ComponentLink1Description: Datasheet; ComponentLink1URL: https://wmsc.lcsc.com/wmsc/upload/file/pdf/v2/lcsc/2304140030_TDK-MLZ1608N100LTD25_C307750.pdf; ComponentLink2Description: JLCPCB Part URL; ComponentLink2URL: https://jlcpcb.com/partdetail/C307750; ComponentLink3Description: LCSC Part URL; ComponentLink3URL: https://lcsc.com/product-detail/Inductors-SMD_TDK-TDK-MLZ1608N100LTD25_C307750.html
footprint IND-0603 (0603 (1608M) Inductor)
pins: 1, 2

## MPH160805S1R0MT
designator L?  Inductance: 1uH
Inductor, 1uH, ±20%, 320mΩ, 580mA, SMD 0603; Manufacturer: Sunlord; Manufacturer Part Number: MPH160805S1R0MT; Package Size: 0603; JLCPCB Basic Part: No; JLCPCB Part Number: C279924; Supplier 1: LCSC; Category: Inductors; Supplier Part Number 1: C279924; Tolerance: ±20%; Rated Current: 580mA; Saturation Current: 580mA; DC Resistance: 320mΩ; RoHS: Yes; ComponentLink1Description: Datasheet; ComponentLink1URL: https://wmsc.lcsc.com/wmsc/upload/file/pdf/v2/lcsc/2310271626_Sunlord-MPH160805S1R0MT_C279924.pdf; ComponentLink2Description: JLCPCB Part URL; ComponentLink2URL: https://jlcpcb.com/partdetail/C279924; ComponentLink3Description: LCSC Part URL; ComponentLink3URL: https://lcsc.com/product-detail/Inductors-SMD_Sunlord-Sunlord-MPH160805S1R0MT_C279924.html
footprint IND-0603 (0603 (1608M) Inductor)
pins: 1, 2

## MPL1608S1R0MHT
designator L?  Inductance: 1uH
Inductor, 1uH, ±20%, 200mΩ, 950mA, SMD 0603; Manufacturer: Sunlord; Manufacturer Part Number: MPL1608S1R0MHT; Package Size: 0603; JLCPCB Basic Part: No; JLCPCB Part Number: C98326; Supplier 1: LCSC; Category: Inductors; Supplier Part Number 1: C98326; Tolerance: ±20%; Rated Current: 950mA; DC Resistance: 200mΩ; RoHS: Yes; ComponentLink1Description: Datasheet; ComponentLink1URL: https://wmsc.lcsc.com/wmsc/upload/file/pdf/v2/lcsc/2304140030_Sunlord-MPL1608S1R0MHT_C98326.pdf; ComponentLink2Description: JLCPCB Part URL; ComponentLink2URL: https://jlcpcb.com/partdetail/C98326; ComponentLink3Description: LCSC Part URL; ComponentLink3URL: https://lcsc.com/product-detail/Inductors-SMD_Sunlord-Sunlord-MPL1608S1R0MHT_C98326.html
footprint IND-0603 (0603 (1608M) Inductor)
pins: 1, 2

## MPL1608S2R2MHT
designator L?  Inductance: 2.2uH
Inductor, 2.2uH, ±20%, 300mΩ, 750mA, SMD 0603; Manufacturer: Sunlord; Manufacturer Part Number: MPL1608S2R2MHT; Package Size: 0603; JLCPCB Basic Part: No; JLCPCB Part Number: C98327; Supplier 1: LCSC; Category: Inductors; Supplier Part Number 1: C98327; Tolerance: ±20%; Rated Current: 750mA; DC Resistance: 300mΩ; RoHS: Yes; ComponentLink1Description: Datasheet; ComponentLink1URL: https://wmsc.lcsc.com/wmsc/upload/file/pdf/v2/lcsc/2304140030_Sunlord-MPL1608S2R2MHT_C98327.pdf; ComponentLink2Description: JLCPCB Part URL; ComponentLink2URL: https://jlcpcb.com/partdetail/C98327; ComponentLink3Description: LCSC Part URL; ComponentLink3URL: https://lcsc.com/product-detail/Inductors-SMD_Sunlord-Sunlord-MPL1608S2R2MHT_C98327.html
footprint IND-0603 (0603 (1608M) Inductor)
pins: 1, 2

## MPL1608S3R3MHT
designator L?  Inductance: 3.3uH
Inductor, 3.3uH, ±20%, SMD 0603; Manufacturer: Sunlord; Manufacturer Part Number: MPL1608S3R3MHT; Package Size: 0603; JLCPCB Basic Part: No; JLCPCB Part Number: C98328; Supplier 1: LCSC; Category: Inductors; Supplier Part Number 1: C98328; Tolerance: ±20%; RoHS: Yes; ComponentLink1Description: Datasheet; ComponentLink1URL: https://wmsc.lcsc.com/wmsc/upload/file/pdf/v2/lcsc/2401121727_Sunlord-MPL1608S3R3MHT_C98328.pdf; ComponentLink2Description: JLCPCB Part URL; ComponentLink2URL: https://jlcpcb.com/partdetail/C98328; ComponentLink3Description: LCSC Part URL; ComponentLink3URL: https://lcsc.com/product-detail/Inductors-SMD_Sunlord-Sunlord-MPL1608S3R3MHT_C98328.html
footprint IND-0603 (0603 (1608M) Inductor)
pins: 1, 2

## MPL1608S4R7MHT
designator L?  Inductance: 4.7uH
Inductor, 4.7uH, ±20%, SMD 0603; Manufacturer: Sunlord; Manufacturer Part Number: MPL1608S4R7MHT; Package Size: 0603; JLCPCB Basic Part: No; JLCPCB Part Number: C98329; Supplier 1: LCSC; Category: Inductors; Supplier Part Number 1: C98329; Tolerance: ±20%; RoHS: Yes; ComponentLink1Description: Datasheet; ComponentLink1URL: https://wmsc.lcsc.com/wmsc/upload/file/pdf/v2/lcsc/2208251530_Sunlord-MPL1608S4R7MHT_C98329.pdf; ComponentLink2Description: JLCPCB Part URL; ComponentLink2URL: https://jlcpcb.com/partdetail/C98329; ComponentLink3Description: LCSC Part URL; ComponentLink3URL: https://lcsc.com/product-detail/Inductors-SMD_Sunlord-Sunlord-MPL1608S4R7MHT_C98329.html
footprint IND-0603 (0603 (1608M) Inductor)
pins: 1, 2

## MPL1608SR47MHT
designator L?  Inductance: 470nH
Inductor, 470nH, ±20%, 312.5mΩ, 800mA, SMD 0603; Manufacturer: Sunlord; Manufacturer Part Number: MPL1608SR47MHT; Package Size: 0603; JLCPCB Basic Part: No; JLCPCB Part Number: C192440; Supplier 1: LCSC; Category: Inductors; Supplier Part Number 1: C192440; Tolerance: ±20%; Rated Current: 800mA; DC Resistance: 312.5mΩ; RoHS: Yes; ComponentLink1Description: Datasheet; ComponentLink1URL: https://wmsc.lcsc.com/wmsc/upload/file/pdf/v2/lcsc/2304140030_Sunlord-MPL1608SR47MHT_C192440.pdf; ComponentLink2Description: JLCPCB Part URL; ComponentLink2URL: https://jlcpcb.com/partdetail/C192440; ComponentLink3Description: LCSC Part URL; ComponentLink3URL: https://lcsc.com/product-detail/Inductors-SMD_Sunlord-Sunlord-MPL1608SR47MHT_C192440.html
footprint IND-0603 (0603 (1608M) Inductor)
pins: 1, 2

## MWSD1608FE4R7KT
designator L?  Inductance: 4.7uH
Inductor, 4.7uH, ±10%, 970mΩ, 420mA, SMD 0603; Manufacturer: Sunlord; Manufacturer Part Number: MWSD1608FE4R7KT; Package Size: 0603; JLCPCB Basic Part: No; JLCPCB Part Number: C516807; Supplier 1: LCSC; Category: Inductors; Supplier Part Number 1: C516807; Tolerance: ±10%; Rated Current: 420mA; DC Resistance: 970mΩ; RoHS: Yes; ComponentLink1Description: Datasheet; ComponentLink1URL: https://wmsc.lcsc.com/wmsc/upload/file/pdf/v2/lcsc/2310301640_Sunlord-MWSD1608FE4R7KT_C516807.pdf; ComponentLink2Description: JLCPCB Part URL; ComponentLink2URL: https://jlcpcb.com/partdetail/C516807; ComponentLink3Description: LCSC Part URL; ComponentLink3URL: https://lcsc.com/product-detail/Inductors-SMD_Sunlord-Sunlord-MWSD1608FE4R7KT_C516807.html
footprint IND-0603 (0603 (1608M) Inductor)
pins: 1, 2

## MWSD1608FE470KT
designator L?  Inductance: 47uH
Inductor, 47uH, ±10%, 6.65Ω, 100mA, SMD 0603; Manufacturer: Sunlord; Manufacturer Part Number: MWSD1608FE470KT; Self-Resonant Frequency: 14MHz; Package Size: 0603; JLCPCB Basic Part: No; JLCPCB Part Number: C2838021; Supplier 1: LCSC; Category: Inductors; Supplier Part Number 1: C2838021; Tolerance: ±10%; Rated Current: 100mA; DC Resistance: 6.65Ω; RoHS: Yes; ComponentLink1Description: Datasheet; ComponentLink1URL: https://wmsc.lcsc.com/wmsc/upload/file/pdf/v2/lcsc/2310271637_Sunlord-MWSD1608FE470KT_C2838021.pdf; ComponentLink2Description: JLCPCB Part URL; ComponentLink2URL: https://jlcpcb.com/partdetail/C2838021; ComponentLink3Description: LCSC Part URL; ComponentLink3URL: https://lcsc.com/product-detail/Inductors-SMD_Sunlord-Sunlord-MWSD1608FE470KT_C2838021.html
footprint IND-0603 (0603 (1608M) Inductor)
pins: 1, 2

## PWCWAQ1608F-1R0KTT
designator L?  Inductance: 1uH
Inductor, 1uH, ±10%, 416mΩ, 680mA, SMD 0603; Manufacturer: PROD Tech; Manufacturer Part Number: PWCWAQ1608F-1R0KTT; Package Size: 0603; JLCPCB Basic Part: No; JLCPCB Part Number: C436781; Supplier 1: LCSC; Category: Inductors; Supplier Part Number 1: C436781; Tolerance: ±10%; Rated Current: 680mA; DC Resistance: 416mΩ; RoHS: Yes; ComponentLink1Description: Datasheet; ComponentLink1URL: https://wmsc.lcsc.com/wmsc/upload/file/pdf/v2/lcsc/2211161730_PROD-Tech-PWCWAQ1608F-1R0KTT_C436781.pdf; ComponentLink2Description: JLCPCB Part URL; ComponentLink2URL: https://jlcpcb.com/partdetail/C436781; ComponentLink3Description: LCSC Part URL; ComponentLink3URL: https://lcsc.com/product-detail/Inductors-SMD_PROD-Tech-PROD-Tech-PWCWAQ1608F-1R0KTT_C436781.html
footprint IND-0603 (0603 (1608M) Inductor)
pins: 1, 2

## PWCWAQ1608F-2R2KTT
designator L?  Inductance: 2.2uH
Inductor, 2.2uH, ±10%, 728mΩ, 580mA, SMD 0603; Manufacturer: PROD Tech; Manufacturer Part Number: PWCWAQ1608F-2R2KTT; Self-Resonant Frequency: 90MHz; Package Size: 0603; JLCPCB Basic Part: No; JLCPCB Part Number: C436782; Supplier 1: LCSC; Category: Inductors; Supplier Part Number 1: C436782; Tolerance: ±10%; Rated Current: 580mA; DC Resistance: 728mΩ; RoHS: Yes; ComponentLink1Description: Datasheet; ComponentLink1URL: https://wmsc.lcsc.com/wmsc/upload/file/pdf/v2/lcsc/2211161730_PROD-Tech-PWCWAQ1608F-2R2KTT_C436782.pdf; ComponentLink2Description: JLCPCB Part URL; ComponentLink2URL: https://jlcpcb.com/partdetail/C436782; ComponentLink3Description: LCSC Part URL; ComponentLink3URL: https://lcsc.com/product-detail/Inductors-SMD_PROD-Tech-PROD-Tech-PWCWAQ1608F-2R2KTT_C436782.html
footprint IND-0603 (0603 (1608M) Inductor)
pins: 1, 2

## PWCWAQ1608F-4R7KTT
designator L?  Inductance: 4.7uH
Inductor, 4.7uH, ±10%, 1.261Ω, 420mA, SMD 0603; Manufacturer: PROD Tech; Manufacturer Part Number: PWCWAQ1608F-4R7KTT; Self-Resonant Frequency: 50MHz; Package Size: 0603; JLCPCB Basic Part: No; JLCPCB Part Number: C436783; Supplier 1: LCSC; Category: Inductors; Supplier Part Number 1: C436783; Tolerance: ±10%; Rated Current: 420mA; DC Resistance: 1.261Ω; RoHS: Yes; ComponentLink1Description: Datasheet; ComponentLink1URL: https://wmsc.lcsc.com/wmsc/upload/file/pdf/v2/lcsc/2304140030_PROD-Tech-PWCWAQ1608F-4R7KTT_C436783.pdf; ComponentLink2Description: JLCPCB Part URL; ComponentLink2URL: https://jlcpcb.com/partdetail/C436783; ComponentLink3Description: LCSC Part URL; ComponentLink3URL: https://lcsc.com/product-detail/Inductors-SMD_PROD-Tech-PROD-Tech-PWCWAQ1608F-4R7KTT_C436783.html
footprint IND-0603 (0603 (1608M) Inductor)
pins: 1, 2

## PWCWAQ1608F-100KTT
designator L?  Inductance: 10uH
Inductor, 10uH, ±10%, 2.405Ω, 280mA, SMD 0603; Manufacturer: PROD Tech; Manufacturer Part Number: PWCWAQ1608F-100KTT; Self-Resonant Frequency: 35MHz; Package Size: 0603; JLCPCB Basic Part: No; JLCPCB Part Number: C436784; Supplier 1: LCSC; Category: Inductors; Supplier Part Number 1: C436784; Tolerance: ±10%; Rated Current: 280mA; DC Resistance: 2.405Ω; RoHS: Yes; ComponentLink1Description: Datasheet; ComponentLink1URL: https://wmsc.lcsc.com/wmsc/upload/file/pdf/v2/lcsc/2304140030_PROD-Tech-PWCWAQ1608F-100KTT_C436784.pdf; ComponentLink2Description: JLCPCB Part URL; ComponentLink2URL: https://jlcpcb.com/partdetail/C436784; ComponentLink3Description: LCSC Part URL; ComponentLink3URL: https://lcsc.com/product-detail/Inductors-SMD_PROD-Tech-PROD-Tech-PWCWAQ1608F-100KTT_C436784.html
footprint IND-0603 (0603 (1608M) Inductor)
pins: 1, 2

## PWCWAQ1608F-150KTT
designator L?  Inductance: 15uH
Inductor, 15uH, ±10%, 3.38Ω, 200mA, SMD 0603; Manufacturer: PROD Tech; Manufacturer Part Number: PWCWAQ1608F-150KTT; Package Size: 0603; JLCPCB Basic Part: No; JLCPCB Part Number: C2983044; Supplier 1: LCSC; Category: Inductors; Supplier Part Number 1: C2983044; Tolerance: ±10%; Rated Current: 200mA; DC Resistance: 3.38Ω; RoHS: Yes; ComponentLink1Description: Datasheet; ComponentLink1URL: https://wmsc.lcsc.com/wmsc/upload/file/pdf/v2/lcsc/2203252253_PROD-Tech-PWCWAQ1608F-150KTT_C2983044.pdf; ComponentLink2Description: JLCPCB Part URL; ComponentLink2URL: https://jlcpcb.com/partdetail/C2983044; ComponentLink3Description: LCSC Part URL; ComponentLink3URL: https://lcsc.com/product-detail/Inductors-SMD_PROD-Tech-PROD-Tech-PWCWAQ1608F-150KTT_C2983044.html
footprint IND-0603 (0603 (1608M) Inductor)
pins: 1, 2
